# Altium footprint library Molex FFC - FPC Connectors (SMT).PcbLib: 638 footprints (part 9 of 40)
Each footprint in its own frame and in the unit in brackets; x right, y up, seen from the top. Pads: shape width x height; smd on the part's side, far side on the other; paste and mask are expansions set on the pad; w line width, h text height; cw(c..) or ccw(c..) is an arc to the next point about the centre after c.
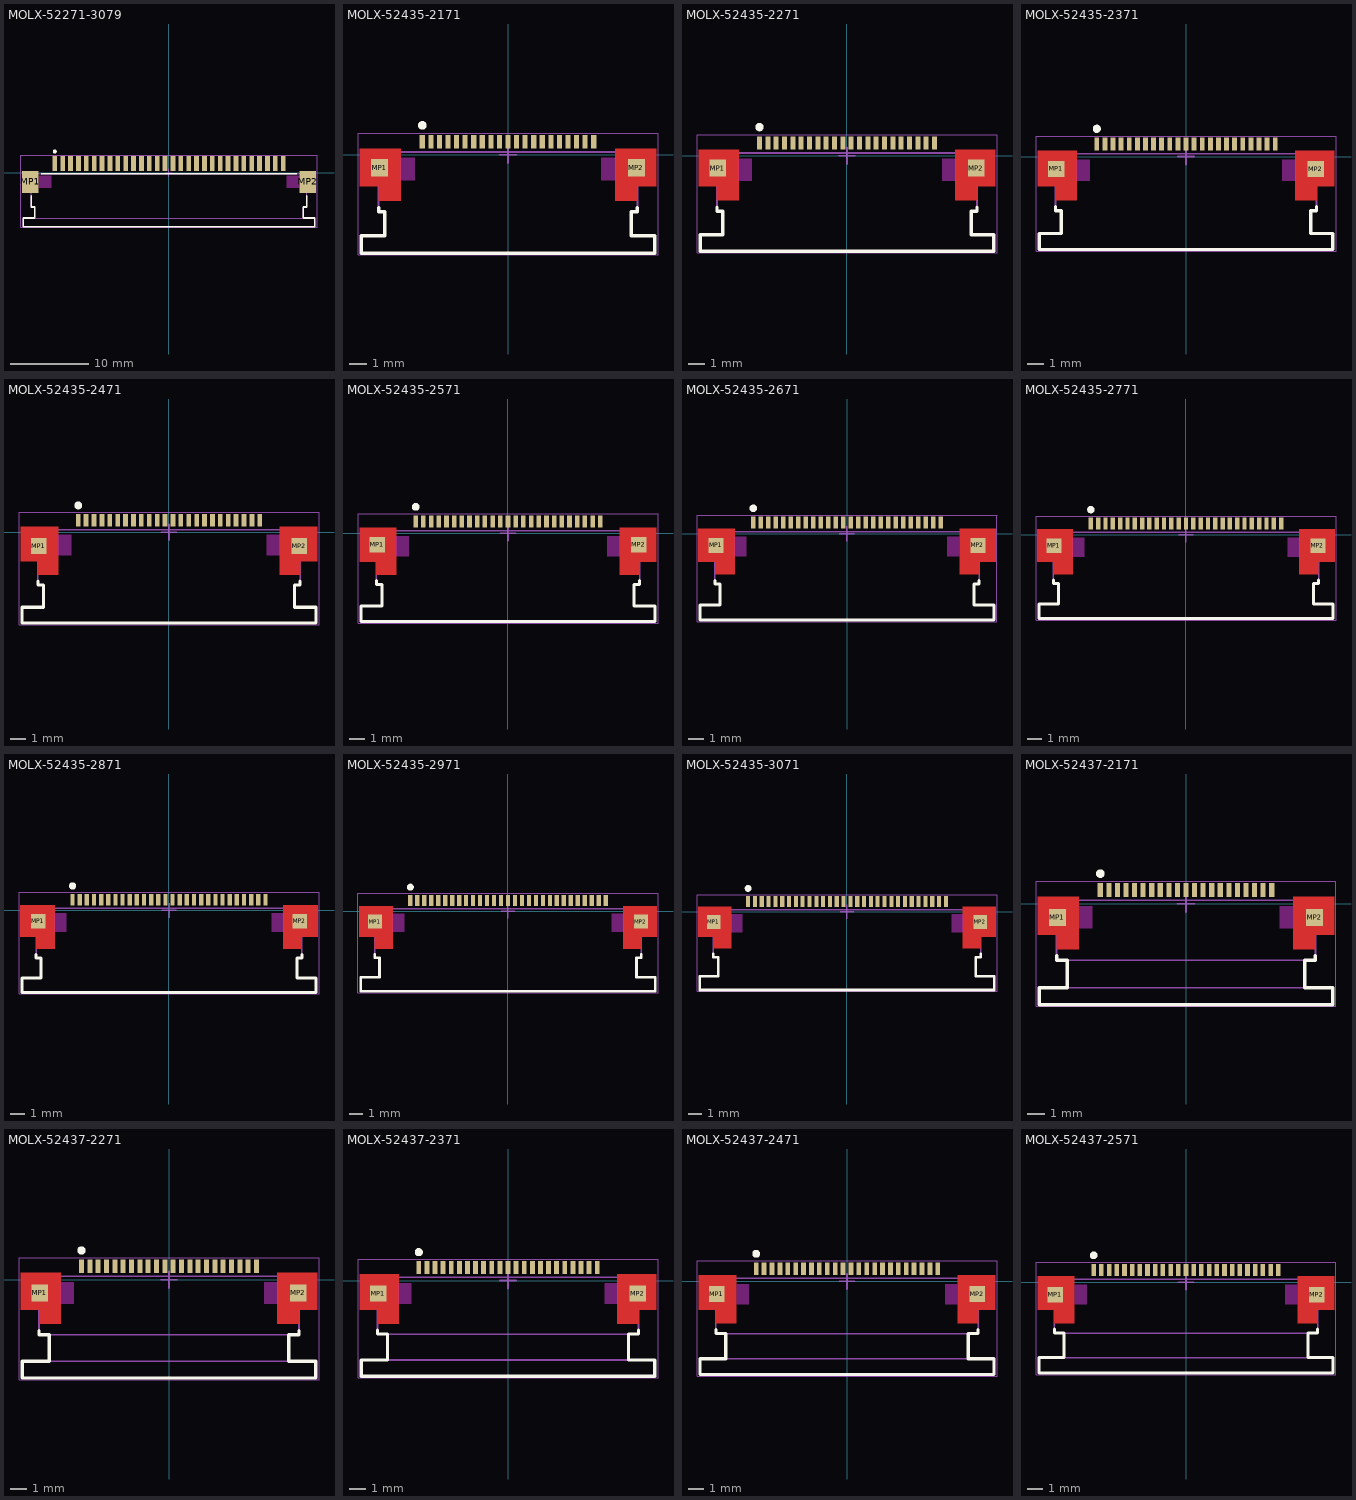
[diagram p8: the footprints below, top view; thin cyan lines are the x and y axes]

## MOLX-52271-3079 [mm] "FPC Connector, 30-Leads, Right Angle, Pitch 1.0 mm, Mated Height 3.0 mm, SMT"
height 3.012
pads (32):
  rect 0.6x1.9 smd: 1(-14.5,1.175) 2(-13.5,1.175) 3(-12.5,1.175) 4(-11.5,1.175) 5(-10.5,1.175) 6(-9.5,1.175) 7(-8.5,1.175) 8(-7.5,1.175) 9(-6.5,1.175) 10(-5.5,1.175) 11(-4.5,1.175) 12(-3.5,1.175) 13(-2.5,1.175) 14(-1.5,1.175) 15(-0.5,1.175) 16(0.5,1.175) 17(1.5,1.175) 18(2.5,1.175) 19(3.5,1.175) 20(4.5,1.175) 21(5.5,1.175) 22(6.5,1.175) 23(7.5,1.175) 24(8.5,1.175) 25(9.5,1.175) 26(10.5,1.175) 27(11.5,1.175) 28(12.5,1.175) 29(13.5,1.175) 30(14.5,1.175)
  rect 2.1x2.8 smd: MP1(-17.65,-1.175) MP2(17.65,-1.175)
Top Overlay:
  circle w0.25: c-14.5,2.675 r0.125
  lines w0.2: -17.5,-2.975 -17.5,-4.375 -17.05,-4.375 -17.05,-5.775 -18.5,-5.775 -18.5,-6.875 18.5,-6.875 18.5,-5.775 17.05,-5.775 17.05,-4.375 17.5,-4.375 17.5,-2.975 ; -16.2,-0.175 16.2,-0.175
Keep-Out Layer:
  region: -14.95,-0.375 -16.6,-0.375 -16.6,-1.975 -14.95,-1.975
  region: -14.95,-0.375 -16.6,-0.375 -16.6,-1.975 -14.95,-1.975
  rectangle: 14.95,-1.975 16.6,-0.375
Mechanical 13:
  lines w0.1: -17.05,-5.775 -17.05,-4.375 -17.5,-4.375 -17.5,-0.175 17.5,-0.175 17.5,-4.375 17.05,-4.375 17.05,-5.775 ; -18.5,-6.875 -18.5,-5.775 18.5,-5.775 18.5,-6.875 -18.5,-6.875
Mechanical 15:
  lines w0.05: -18.8,-6.975 -18.8,2.225 18.8,2.225 18.8,-6.975 -18.8,-6.975
  lines w0.1: -0.5,0 0.5,0 ; 0,-0.5 0,0.5
3D body: height 0.25, standoff 0, extent -18.5,-6.875 18.5,1.825

## MOLX-52435-2171 [mm] "FPC Connector, 21-Leads, Right Angle, Pitch 0.5 mm, Mated Height 2.0 mm, SMT"
height 2.05
pads (23):
  rect 0.3x0.8 smd: 1(-5,0.762) 2(-4.5,0.762) 3(-4,0.762) 4(-3.5,0.762) 5(-3,0.762) 6(-2.5,0.762) 7(-2,0.762) 8(-1.5,0.762) 9(-1,0.762) 10(-0.5,0.762) 11(0,0.762) 12(0.5,0.762) 13(1,0.762) 14(1.5,0.762) 15(2,0.762) 16(2.5,0.762) 17(3,0.762) 18(3.5,0.762) 19(4,0.762) 20(4.5,0.762) 21(5,0.762)
  rect 1x1 smd paste-0.06: MP1(-7.493,-0.762) MP2(7.493,-0.762)
Top Layer:
  region: -6.25,0.362 -8.65,0.362 -8.65,-1.838 -7.55,-1.838 -7.55,-2.688 -6.25,-2.688
  region: 6.25,0.362 8.65,0.362 8.65,-1.838 7.55,-1.838 7.55,-2.688 6.25,-2.688
Top Overlay:
  circle w0.25: c-5,1.712 r0.125
  lines w0.2: -7.55,-3.088 -7.55,-3.338 -7.2,-3.338 -7.2,-4.738 -8.55,-4.738 -8.55,-5.738 8.55,-5.738 8.55,-4.738 7.2,-4.738 7.2,-3.338 7.55,-3.338 7.55,-3.088
Keep-Out Layer:
  region: -6.25,-0.188 -5.45,-0.188 -5.45,-1.488 -6.25,-1.488
  region: 6.25,-0.188 5.45,-0.188 5.45,-1.488 6.25,-1.488
Mechanical 13:
  lines w0.1: -7.2,-3.338 -7.55,-3.338 -7.55,0.162 7.55,0.162 7.55,-3.338 7.2,-3.338 7.2,-4.738 8.55,-4.738 8.55,-5.738 -8.55,-5.738 -8.55,-4.738 -7.2,-4.738 -7.2,-3.338
Mechanical 15:
  lines w0.05: -8.75,-5.838 8.75,-5.838 8.75,1.262 -8.75,1.262 -8.75,-5.838
  lines w0.1: -0.5,0 0.5,0 ; 0,-0.5 0,0.5
3D body: height 0.25, standoff 0, extent -8.55,-5.738 8.55,0.862

## MOLX-52435-2271 [mm] "FPC Connector, 22-Leads, Right Angle, Pitch 0.5 mm, Mated Height 2.0 mm, SMT"
height 2.05
pads (24):
  rect 0.3x0.8 smd: 1(-5.25,0.762) 2(-4.75,0.762) 3(-4.25,0.762) 4(-3.75,0.762) 5(-3.25,0.762) 6(-2.75,0.762) 7(-2.25,0.762) 8(-1.75,0.762) 9(-1.25,0.762) 10(-0.75,0.762) 11(-0.25,0.762) 12(0.25,0.762) 13(0.75,0.762) 14(1.25,0.762) 15(1.75,0.762) 16(2.25,0.762) 17(2.75,0.762) 18(3.25,0.762) 19(3.75,0.762) 20(4.25,0.762) 21(4.75,0.762) 22(5.25,0.762)
  rect 1x1 smd: MP1(-7.75,-0.742) MP2(7.75,-0.742)
Top Layer:
  region: -6.5,0.362 -8.9,0.362 -8.9,-1.838 -7.8,-1.838 -7.8,-2.688 -6.5,-2.688
  region: 6.5,0.362 8.9,0.362 8.9,-1.838 7.8,-1.838 7.8,-2.688 6.5,-2.688
Top Overlay:
  circle w0.25: c-5.25,1.712 r0.125
  lines w0.2: -7.8,-3.088 -7.8,-3.338 -7.45,-3.338 -7.45,-4.738 -8.8,-4.738 -8.8,-5.738 8.8,-5.738 8.8,-4.738 7.45,-4.738 7.45,-3.339 7.8,-3.339 7.8,-3.088
Keep-Out Layer:
  region: 5.7,-0.198 6.5,-0.198 6.5,-1.498 5.7,-1.498
  region: -6.5,-0.198 -5.7,-0.198 -5.7,-1.498 -6.5,-1.498
Mechanical 13:
  lines w0.1: -8.8,-5.738 8.8,-5.738 8.8,-4.738 7.45,-4.738 7.45,-3.338 7.8,-3.338 7.8,0.162 -7.8,0.162 -7.8,-3.338 -7.45,-3.338 -7.45,-4.738 -8.8,-4.738 -8.8,-5.738
Mechanical 15:
  lines w0.05: -9,-5.838 -9,1.262 9,1.262 9,-5.838 -9,-5.838
  lines w0.1: -0.5,0 0.5,0 ; 0,-0.5 0,0.5
3D body: height 0.25, standoff 0, extent -8.8,-5.738 8.8,0.862

## MOLX-52435-2371 [mm] "FPC Connector, 23-Leads, Right Angle, Pitch 0.5 mm, Mated Height 2.0 mm, SMT"
height 2.05
pads (25):
  rect 0.3x0.8 smd: 1(-5.5,0.762) 2(-5,0.762) 3(-4.5,0.762) 4(-4,0.762) 5(-3.5,0.762) 6(-3,0.762) 7(-2.5,0.762) 8(-2,0.762) 9(-1.5,0.762) 10(-1,0.762) 11(-0.5,0.762) 12(0,0.762) 13(0.5,0.762) 14(1,0.762) 15(1.5,0.762) 16(2,0.762) 17(2.5,0.762) 18(3,0.762) 19(3.5,0.762) 20(4,0.762) 21(4.5,0.762) 22(5,0.762) 23(5.5,0.762)
  rect 1x1 smd: MP1(-8,-0.767) MP2(8,-0.772)
Top Layer:
  region: -6.75,0.362 -9.15,0.362 -9.15,-1.838 -8.05,-1.838 -8.05,-2.688 -6.75,-2.688
  region: 6.75,0.362 9.15,0.362 9.15,-1.838 8.05,-1.838 8.05,-2.688 6.75,-2.688
Top Overlay:
  circle w0.25: c-5.5,1.712 r0.125
  lines w0.2: -8.05,-3.088 -8.05,-3.338 -7.7,-3.338 -7.7,-4.738 -9.05,-4.738 -9.05,-5.738 9.05,-5.738 9.05,-4.738 7.7,-4.738 7.7,-3.338 8.05,-3.338 8.05,-3.088
Keep-Out Layer:
  region: -6.75,-0.183 -5.95,-0.183 -5.95,-1.483 -6.75,-1.483
  region: 5.95,-0.183 6.75,-0.183 6.75,-1.483 5.95,-1.483
Mechanical 13:
  lines w0.1: 8.05,0.162 -8.05,0.162 -8.05,-3.338 -7.7,-3.338 -7.7,-4.738 -9.05,-4.738 -9.05,-5.738 9.05,-5.738 9.05,-4.738 7.7,-4.738 7.7,-3.338 8.05,-3.338 8.05,0.162
Mechanical 15:
  lines w0.05: -9.25,-5.838 9.25,-5.838 9.25,1.262 -9.25,1.262 -9.25,-5.838
  lines w0.1: -0.5,0 0.5,0 ; 0,-0.5 0,0.5
3D body: height 0.25, standoff 0, extent -9.05,-5.738 9.05,0.862

## MOLX-52435-2471 [mm] "FPC Connector, 24-Leads, Right Angle, Pitch 0.5 mm, Mated Height 2.0 mm, SMT"
height 2.05
pads (26):
  rect 0.3x0.8 smd: 1(-5.75,0.762) 2(-5.25,0.762) 3(-4.75,0.762) 4(-4.25,0.762) 5(-3.75,0.762) 6(-3.25,0.762) 7(-2.75,0.762) 8(-2.25,0.762) 9(-1.75,0.762) 10(-1.25,0.762) 11(-0.75,0.762) 12(-0.25,0.762) 13(0.25,0.762) 14(0.75,0.762) 15(1.25,0.762) 16(1.75,0.762) 17(2.25,0.762) 18(2.75,0.762) 19(3.25,0.762) 20(3.75,0.762) 21(4.25,0.762) 22(4.75,0.762) 23(5.25,0.762) 24(5.75,0.762)
  rect 1x1 smd: MP1(-8.25,-0.863) MP2(8.25,-0.863)
Top Layer:
  region: 7,0.362 9.4,0.362 9.4,-1.838 8.3,-1.838 8.3,-2.688 7,-2.688
  region: -7,0.362 -9.4,0.362 -9.4,-1.838 -8.3,-1.838 -8.3,-2.688 -7,-2.688
Top Overlay:
  circle w0.25: c-5.75,1.712 r0.125
  lines w0.2: -8.3,-3.338 -7.95,-3.338 -7.95,-4.738 -9.3,-4.738 -9.3,-5.738 ; -8.3,-3.338 -8.3,-3.088 ; 8.3,-3.338 8.3,-3.088 ; 8.3,-3.338 7.95,-3.338 7.95,-4.738 9.3,-4.738 9.3,-5.738 ; -9.3,-5.738 -9.3,-5.738 ; -9.3,-5.738 9.3,-5.738 ; 9.3,-5.738 9.3,-5.738
Keep-Out Layer:
  region: 6.2,-0.137 7,-0.137 7,-1.438 6.2,-1.438
  region: -7,-0.137 -6.2,-0.137 -6.2,-1.438 -7,-1.438
Mechanical 13:
  lines w0.1: -8.3,-3.338 -7.95,-3.338 ; -8.3,-3.338 -8.3,0.162 8.3,0.162 8.3,-3.338 ; -7.95,-3.338 -7.95,-4.738 -9.3,-4.738 -9.3,-5.738 9.3,-5.738 9.3,-4.738 7.95,-4.738 7.95,-3.338 ; 7.95,-3.338 8.3,-3.338
Mechanical 15:
  lines w0.05: -9.5,-5.838 9.5,-5.838 9.5,1.262 -9.5,1.262 -9.5,-5.838
  lines w0.1: -0.5,0 0.5,0 ; 0,-0.5 0,0.5
3D body: height 0.25, standoff 0, extent -9.3,-5.738 9.3,0.862

## MOLX-52435-2571 [mm] "FPC Connector, 25-Leads, Right Angle, Pitch 0.5 mm, Mated Height 2.0 mm, SMT"
height 2.05
pads (27):
  rect 0.3x0.8 smd: 1(-6,0.762) 2(-5.5,0.762) 3(-5,0.762) 4(-4.5,0.762) 5(-4,0.762) 6(-3.5,0.762) 7(-3,0.762) 8(-2.5,0.762) 9(-2,0.762) 10(-1.5,0.762) 11(-1,0.762) 12(-0.5,0.762) 13(0,0.762) 14(0.5,0.762) 15(1,0.762) 16(1.5,0.762) 17(2,0.762) 18(2.5,0.762) 19(3,0.762) 20(3.5,0.762) 21(4,0.762) 22(4.5,0.762) 23(5,0.762) 24(5.5,0.762) 25(6,0.762)
  rect 1x1 smd: MP1(-8.509,-0.752) MP2(8.509,-0.752)
Top Layer:
  region: -7.25,0.362 -9.65,0.362 -9.65,-1.838 -8.55,-1.838 -8.55,-2.688 -7.25,-2.688
  region: 7.25,0.362 9.65,0.362 9.65,-1.838 8.55,-1.838 8.55,-2.688 7.25,-2.688
Top Overlay:
  circle w0.25: c-6,1.712 r0.125
  lines w0.2: -8.55,-3.338 -8.2,-3.338 -8.2,-4.738 -9.55,-4.738 -9.55,-5.738 9.55,-5.738 9.55,-4.738 8.2,-4.738 8.2,-3.338 8.55,-3.338 ; -8.55,-3.338 -8.55,-3.088 ; 8.55,-3.338 8.55,-3.088
Keep-Out Layer:
  region: -7.25,-0.193 -6.45,-0.193 -6.45,-1.493 -7.25,-1.493
  region: 6.45,-0.193 7.25,-0.193 7.25,-1.493 6.45,-1.493
Mechanical 13:
  lines w0.1: -8.55,-3.338 -8.2,-3.338 ; -8.55,-3.338 -8.55,0.162 8.55,0.162 8.55,-3.338 ; -8.2,-3.338 -8.2,-4.738 -9.55,-4.738 -9.55,-5.738 9.55,-5.738 9.55,-4.738 8.2,-4.738 8.2,-3.338 ; 8.2,-3.338 8.55,-3.338
Mechanical 15:
  lines w0.05: -9.75,-5.838 -9.75,1.262 9.75,1.262 9.75,-5.838 -9.75,-5.838
  lines w0.1: -0.5,0 0.5,0 ; 0,-0.5 0,0.5
3D body: height 0.25, standoff 0, extent -9.55,-5.738 9.55,0.862

## MOLX-52435-2671 [mm] "FPC Connector, 26-Leads, Right Angle, Pitch 0.5 mm, Mated Height 2.0 mm, SMT"
height 2.062
pads (28):
  rect 0.3x0.8 smd: 1(-6.25,0.762) 2(-5.75,0.762) 3(-5.25,0.762) 4(-4.75,0.762) 5(-4.25,0.762) 6(-3.75,0.762) 7(-3.25,0.762) 8(-2.75,0.762) 9(-2.25,0.762) 10(-1.75,0.762) 11(-1.25,0.762) 12(-0.75,0.762) 13(-0.25,0.762) 14(0.25,0.762) 15(0.75,0.762) 16(1.25,0.762) 17(1.75,0.762) 18(2.25,0.762) 19(2.75,0.762) 20(3.25,0.762) 21(3.75,0.762) 22(4.25,0.762) 23(4.75,0.762) 24(5.25,0.762) 25(5.75,0.762) 26(6.25,0.762)
  rect 1x1 smd paste+0 mask+0: MP1(-8.727,-0.762) MP2(8.727,-0.762)
Top Layer:
  region: 7.5,0.362 9.9,0.362 9.9,-1.838 8.8,-1.838 8.8,-2.688 7.5,-2.688
  region: -7.5,0.362 -9.9,0.362 -9.9,-1.838 -8.8,-1.838 -8.8,-2.688 -7.5,-2.688
Top Overlay:
  circle w0.25: c-6.25,1.712 r0.125
  lines w0.2: -8.8,-3.088 -8.8,-3.338 -8.45,-3.338 -8.45,-4.738 -9.8,-4.738 -9.8,-5.738 ; 8.8,-3.088 8.8,-3.338 8.45,-3.338 8.45,-4.738 9.8,-4.738 ; 9.8,-4.738 9.8,-5.738 -9.8,-5.738 ; -9.8,-5.738 -9.8,-5.738
Keep-Out Layer:
  region: -7.5,-0.188 -6.7,-0.188 -6.7,-1.488 -7.5,-1.488
  region: 6.7,-0.188 7.5,-0.188 7.5,-1.488 6.7,-1.488
Mechanical 13:
  lines w0.1: -9.8,-5.738 9.8,-5.738 9.8,-4.738 8.45,-4.738 8.45,-3.338 8.8,-3.338 8.8,0.162 -8.8,0.162 -8.8,-3.338 -8.45,-3.338 -8.45,-4.738 -9.8,-4.738 -9.8,-5.738
Mechanical 15:
  lines w0.05: -10,-5.838 -10,1.262 10,1.262 10,-5.838 -10,-5.838
  lines w0.1: -0.5,0 0.5,0 ; 0,-0.5 0,0.5
3D body: height 0.25, standoff 0, extent -9.8,-5.738 9.8,0.862

## MOLX-52435-2771 [mm] "FPC Connector, 27-Leads, Right Angle, Pitch 0.5 mm, Mated Height 2.0 mm, SMT"
height 2.05
pads (29):
  rect 0.3x0.8 smd: 1(-6.5,0.762) 2(-6,0.762) 3(-5.5,0.762) 4(-5,0.762) 5(-4.5,0.762) 6(-4,0.762) 7(-3.5,0.762) 8(-3,0.762) 9(-2.5,0.762) 10(-2,0.762) 11(-1.5,0.762) 12(-1,0.762) 13(-0.5,0.762) 14(0,0.762) 15(0.5,0.762) 16(1,0.762) 17(1.5,0.762) 18(2,0.762) 19(2.5,0.762) 20(3,0.762) 21(3.5,0.762) 22(4,0.762) 23(4.5,0.762) 24(5,0.762) 25(5.5,0.762) 26(6,0.762) 27(6.5,0.762)
  rect 1x1 smd: MP1(-9.017,-0.752) MP2(9.017,-0.752)
Top Layer:
  region: 7.75,0.362 10.15,0.362 10.15,-1.838 9.05,-1.838 9.05,-2.688 7.75,-2.688
  region: -7.75,0.362 -10.15,0.362 -10.15,-1.838 -9.05,-1.838 -9.05,-2.688 -7.75,-2.688
Top Overlay:
  circle w0.25: c-6.5,1.712 r0.125
  lines w0.2: -9.05,-3.088 -9.05,-3.338 -8.7,-3.338 -8.7,-4.738 -10.05,-4.738 -10.05,-5.738 10.05,-5.738 10.05,-4.738 8.7,-4.738 8.7,-3.338 9.05,-3.338 9.05,-3.088
Keep-Out Layer:
  region: 6.95,-0.193 7.75,-0.193 7.75,-1.493 6.95,-1.493
  region: -7.75,-0.193 -6.95,-0.193 -6.95,-1.493 -7.75,-1.493
Mechanical 13:
  lines w0.1: -10.055,-4.738 -8.705,-4.738 -8.705,-3.338 ; -10.05,-4.738 -10.05,-5.738 10.05,-5.738 10.05,-4.738 ; -9.055,0.162 -9.055,-3.338 -8.705,-3.338 ; -9.05,0.162 9.05,0.162 ; 8.705,-3.338 9.055,-3.338 9.055,0.162 ; 8.705,-3.338 8.705,-4.738 10.055,-4.738
Mechanical 15:
  lines w0.05: -10.25,-5.838 10.25,-5.838 10.25,1.262 -10.25,1.262 -10.25,-5.838
  lines w0.1: -0.5,0 0.5,0 ; 0,-0.5 0,0.5
3D body: height 0.25, standoff 0, extent -10.05,-5.743 10.05,0.857

## MOLX-52435-2871 [mm] "FPC Connector, 28-Leads, Right Angle, Pitch 0.5 mm, Mated Height 2.0 mm, SMT"
height 2.05
pads (30):
  rect 0.3x0.8 smd: 1(-6.75,0.762) 2(-6.25,0.762) 3(-5.75,0.762) 4(-5.25,0.762) 5(-4.75,0.762) 6(-4.25,0.762) 7(-3.75,0.762) 8(-3.25,0.762) 9(-2.75,0.762) 10(-2.25,0.762) 11(-1.75,0.762) 12(-1.25,0.762) 13(-0.75,0.762) 14(-0.25,0.762) 15(0.25,0.762) 16(0.75,0.762) 17(1.25,0.762) 18(1.75,0.762) 19(2.25,0.762) 20(2.75,0.762) 21(3.25,0.762) 22(3.75,0.762) 23(4.25,0.762) 24(4.75,0.762) 25(5.25,0.762) 26(5.75,0.762) 27(6.25,0.762) 28(6.75,0.762)
  rect 1x1 smd: MP1(-9.144,-0.752) MP2(9.144,-0.752)
Top Layer:
  region: -8,0.362 -10.4,0.362 -10.4,-1.838 -9.3,-1.838 -9.3,-2.688 -8,-2.688
  region: 8,0.362 10.4,0.362 10.4,-1.838 9.3,-1.838 9.3,-2.688 8,-2.688
Top Overlay:
  circle w0.25: c-6.75,1.712 r0.125
  lines w0.2: -9.3,-3.088 -9.3,-3.338 -8.95,-3.338 -8.95,-4.738 -10.3,-4.738 -10.3,-5.738 10.3,-5.738 10.3,-4.738 8.95,-4.738 8.95,-3.338 9.3,-3.338 9.3,-3.088
Keep-Out Layer:
  region: 7.2,-0.193 8,-0.193 8,-1.493 7.2,-1.493
  region: -8,-0.193 -7.2,-0.193 -7.2,-1.493 -8,-1.493
Mechanical 13:
  lines w0.1: -8.95,-3.338 -9.3,-3.338 -9.3,0.162 9.3,0.162 9.3,-3.338 8.95,-3.338 ; -8.95,-3.338 -8.95,-4.738 -10.3,-4.738 -10.3,-5.738 10.3,-5.738 10.3,-4.738 8.95,-4.738 8.95,-3.338
Mechanical 15:
  lines w0.05: -10.5,-5.838 -10.5,1.262 10.5,1.262 10.5,-5.838 -10.5,-5.838
  lines w0.1: -0.5,0 0.5,0 ; 0,-0.5 0,0.5
3D body: height 0.25, standoff 0, extent -10.3,-5.738 10.3,0.862

## MOLX-52435-2971 [mm] "FPC Connector, 29-Leads, Right Angle, Pitch 0.5 mm, Mated Height 2.0 mm, SMT"
height 2.05
pads (31):
  rect 0.3x0.8 smd: 1(-7,0.762) 2(-6.5,0.762) 3(-6,0.762) 4(-5.5,0.762) 5(-5,0.762) 6(-4.5,0.762) 7(-4,0.762) 8(-3.5,0.762) 9(-3,0.762) 10(-2.5,0.762) 11(-2,0.762) 12(-1.5,0.762) 13(-1,0.762) 14(-0.5,0.762) 15(0,0.762) 16(0.5,0.762) 17(1,0.762) 18(1.5,0.762) 19(2,0.762) 20(2.5,0.762) 21(3,0.762) 22(3.5,0.762) 23(4,0.762) 24(4.5,0.762) 25(5,0.762) 26(5.5,0.762) 27(6,0.762) 28(6.5,0.762) 29(7,0.762)
  rect 1x1 smd: MP1(-9.525,-0.752) MP2(9.525,-0.752)
Top Layer:
  region: 8.25,0.362 10.65,0.362 10.65,-1.838 9.55,-1.838 9.55,-2.688 8.25,-2.688
  region: -8.25,0.362 -10.65,0.362 -10.65,-1.838 -9.55,-1.838 -9.55,-2.688 -8.25,-2.688
Top Overlay:
  circle w0.25: c-7,1.712 r0.125
  lines w0.2: -9.55,-3.088 -9.55,-3.338 -9.2,-3.338 -9.2,-4.738 -10.55,-4.738 -10.55,-5.738 10.55,-5.738 10.55,-4.738 9.2,-4.738 9.2,-3.338 9.55,-3.338 9.55,-3.088
Keep-Out Layer:
  region: 7.45,-0.193 8.25,-0.193 8.25,-1.493 7.45,-1.493
  region: -8.25,-0.193 -7.45,-0.193 -7.45,-1.493 -8.25,-1.493
Mechanical 13:
  lines w0.1: -9.2,-3.338 -9.55,-3.338 -9.55,0.162 9.55,0.162 9.55,-3.338 9.2,-3.338 ; -9.2,-3.338 -9.2,-4.738 -10.55,-4.738 -10.55,-5.738 10.55,-5.738 10.55,-4.738 9.2,-4.738 9.2,-3.338
Mechanical 15:
  lines w0.05: -10.75,-5.838 10.75,-5.838 10.75,1.262 -10.75,1.262 -10.75,-5.838
  lines w0.1: -0.5,0 0.5,0 ; 0,-0.5 0,0.5
3D body: height 0.25, standoff 0, extent -10.55,-5.738 10.55,0.862

## MOLX-52435-3071 [mm] "FPC Connector, 30-Leads, Right Angle, Pitch 0.5 mm, Mated Height 2.0 mm, SMT"
height 2.05
pads (32):
  rect 0.3x0.8 smd: 1(-7.25,0.762) 2(-6.75,0.762) 3(-6.25,0.762) 4(-5.75,0.762) 5(-5.25,0.762) 6(-4.75,0.762) 7(-4.25,0.762) 8(-3.75,0.762) 9(-3.25,0.762) 10(-2.75,0.762) 11(-2.25,0.762) 12(-1.75,0.762) 13(-1.25,0.762) 14(-0.75,0.762) 15(-0.25,0.762) 16(0.25,0.762) 17(0.75,0.762) 18(1.25,0.762) 19(1.75,0.762) 20(2.25,0.762) 21(2.75,0.762) 22(3.25,0.762) 23(3.75,0.762) 24(4.25,0.762) 25(4.75,0.762) 26(5.25,0.762) 27(5.75,0.762) 28(6.25,0.762) 29(6.75,0.762) 30(7.25,0.762)
  rect 1x1 smd: MP1(-9.779,-0.752) MP2(9.779,-0.752)
Top Layer:
  region: 8.5,0.362 10.9,0.362 10.9,-1.838 9.8,-1.838 9.8,-2.688 8.5,-2.688
  region: -8.5,0.362 -10.9,0.362 -10.9,-1.838 -9.8,-1.838 -9.8,-2.688 -8.5,-2.688
Top Overlay:
  circle w0.25: c-7.25,1.712 r0.125
  lines w0.2: -9.8,-3.088 -9.8,-3.338 -9.45,-3.338 -9.45,-4.738 -10.8,-4.738 -10.8,-5.738 10.8,-5.738 10.8,-4.738 9.45,-4.738 9.45,-3.338 9.8,-3.338 9.8,-3.088
Keep-Out Layer:
  region: -8.5,-0.193 -7.7,-0.193 -7.7,-1.493 -8.5,-1.493
  region: 8.5,-0.193 7.7,-0.193 7.7,-1.493 8.5,-1.493
Mechanical 13:
  lines w0.1: -9.45,-3.338 -9.8,-3.338 -9.8,0.162 9.8,0.162 9.8,-3.338 9.45,-3.338 ; -9.45,-3.338 -9.45,-4.738 -10.8,-4.738 -10.8,-5.738 10.8,-5.738 10.8,-4.738 9.45,-4.738 9.45,-3.338
Mechanical 15:
  lines w0.05: -11,-5.838 11,-5.838 11,1.262 -11,1.262 -11,-5.838
  lines w0.1: -0.5,0 0.5,0 ; 0,-0.5 0,0.5
3D body: height 0.25, standoff 0, extent -10.8,-5.738 10.8,0.862

## MOLX-52437-2171 [mm] "FPC Connector, 21-Leads, Right Angle, Pitch 0.5 mm, SMT"
height 2.052
pads (23):
  rect 0.3x0.8 smd: 1(-5,0.8) 2(-4.5,0.8) 3(-4,0.8) 4(-3.5,0.8) 5(-3,0.8) 6(-2.5,0.8) 7(-2,0.8) 8(-1.5,0.8) 9(-1,0.8) 10(-0.5,0.8) 11(0,0.8) 12(0.5,0.8) 13(1,0.8) 14(1.5,0.8) 15(2,0.8) 16(2.5,0.8) 17(3,0.8) 18(3.5,0.8) 19(4,0.8) 20(4.5,0.8) 21(5,0.8)
  rect 1x1 smd: MP1(-7.5,-0.8) MP2(7.5,-0.8)
Top Layer:
  region: -6.25,0.4 -8.65,0.4 -8.65,-1.8 -7.55,-1.8 -7.55,-2.65 -6.25,-2.65
  region: 6.25,0.4 8.65,0.4 8.65,-1.8 7.55,-1.8 7.55,-2.65 6.25,-2.65
Top Overlay:
  circle w0.25: c-5,1.75 r0.125
  lines w0.2: -7.551,-3.05 -7.551,-3.3 -6.931,-3.3 -6.931,-4.9 -8.55,-4.9 ; 7.55,-3.05 7.55,-3.3 6.929,-3.3 6.929,-4.9 8.55,-4.9 ; -8.55,-4.9 -8.55,-5.9 8.55,-5.9 8.55,-4.9 ; -8.55,-4.9 -8.55,-4.9 ; 8.55,-4.9 8.55,-4.9
Keep-Out Layer:
  region: -5.45,-0.15 -6.25,-0.15 -6.25,-1.45 -5.45,-1.45
  rectangle: 5.45,-1.45 6.25,-0.15
Mechanical 13:
  lines w0.1: -6.931,-4.9 6.929,-4.9 ; -6.931,-4.9 -6.931,-3.3 ; -6.931,-4.9 -8.55,-4.9 -8.55,-5.9 8.55,-5.9 8.55,-4.9 6.929,-4.9 ; -6.931,-3.3 6.929,-3.3 ; -6.931,-3.3 -7.551,-3.3 -7.551,0.2 7.55,0.2 7.55,-3.3 6.929,-3.3 ; 6.929,-4.9 6.929,-3.3
Mechanical 15:
  lines w0.05: -8.75,-6 -8.75,1.3 8.75,1.3 8.75,-6 -8.75,-6
  lines w0.1: -0.5,0 0.5,0 ; 0,-0.5 0,0.5
3D body: height 0.25, standoff 0, extent -8.55,-5.9 8.55,0.9

## MOLX-52437-2271 [mm] "FPC Connector, 22-Leads, Right Angle, Pitch 0.5 mm, SMT"
height 2.052
pads (24):
  rect 0.3x0.8 smd: 1(-5.25,0.8) 2(-4.75,0.8) 3(-4.25,0.8) 4(-3.75,0.8) 5(-3.25,0.8) 6(-2.75,0.8) 7(-2.25,0.8) 8(-1.75,0.8) 9(-1.25,0.8) 10(-0.75,0.8) 11(-0.25,0.8) 12(0.25,0.8) 13(0.75,0.8) 14(1.25,0.8) 15(1.75,0.8) 16(2.25,0.8) 17(2.75,0.8) 18(3.25,0.8) 19(3.75,0.8) 20(4.25,0.8) 21(4.75,0.8) 22(5.25,0.8)
  rect 1x1 smd: MP1(-7.75,-0.8) MP2(7.75,-0.8)
Top Layer:
  region: -6.5,0.4 -8.9,0.4 -8.9,-1.8 -7.8,-1.8 -7.8,-2.65 -6.5,-2.65
  region: 6.5,0.4 8.9,0.4 8.9,-1.8 7.8,-1.8 7.8,-2.65 6.5,-2.65
Top Overlay:
  circle w0.25: c-5.25,1.75 r0.125
  lines w0.2: -7.801,-3.05 -7.801,-3.3 -7.181,-3.3 -7.181,-4.9 -8.8,-4.9 ; 7.8,-3.05 7.8,-3.3 7.179,-3.3 7.179,-4.9 8.8,-4.9 ; -8.8,-4.9 -8.8,-5.9 8.8,-5.9 8.8,-4.9 ; -8.8,-4.9 -8.8,-4.9 ; 8.8,-4.9 8.8,-4.9
Keep-Out Layer:
  region: -5.7,-0.15 -6.5,-0.15 -6.5,-1.45 -5.7,-1.45
  rectangle: 5.7,-1.45 6.5,-0.15
Mechanical 13:
  lines w0.1: -7.181,-4.9 7.179,-4.9 ; -7.181,-4.9 -7.181,-3.3 ; -7.181,-4.9 -8.8,-4.9 -8.8,-5.9 8.8,-5.9 8.8,-4.9 7.179,-4.9 ; -7.181,-3.3 7.179,-3.3 ; -7.181,-3.3 -7.801,-3.3 -7.801,0.2 7.8,0.2 7.8,-3.3 7.179,-3.3 ; 7.179,-4.9 7.179,-3.3
Mechanical 15:
  lines w0.05: -9,-6 -9,1.3 9,1.3 9,-6 -9,-6
  lines w0.1: -0.5,0 0.5,0 ; 0,-0.5 0,0.5
3D body: height 0.25, standoff 0, extent -8.8,-5.9 8.8,0.9

## MOLX-52437-2371 [mm] "FPC Connector, 23-Leads, Right Angle, Pitch 0.5 mm, SMT"
height 2.052
pads (25):
  rect 0.3x0.8 smd: 1(-5.5,0.8) 2(-5,0.8) 3(-4.5,0.8) 4(-4,0.8) 5(-3.5,0.8) 6(-3,0.8) 7(-2.5,0.8) 8(-2,0.8) 9(-1.5,0.8) 10(-1,0.8) 11(-0.5,0.8) 12(0,0.8) 13(0.5,0.8) 14(1,0.8) 15(1.5,0.8) 16(2,0.8) 17(2.5,0.8) 18(3,0.8) 19(3.5,0.8) 20(4,0.8) 21(4.5,0.8) 22(5,0.8) 23(5.5,0.8)
  rect 1x1 smd: MP1(-8,-0.8) MP2(8,-0.8)
Top Layer:
  region: -6.75,0.4 -9.15,0.4 -9.15,-1.8 -8.05,-1.8 -8.05,-2.65 -6.75,-2.65
  region: 6.75,0.4 9.15,0.4 9.15,-1.8 8.05,-1.8 8.05,-2.65 6.75,-2.65
Top Overlay:
  circle w0.25: c-5.5,1.75 r0.125
  lines w0.2: -8.051,-3.05 -8.051,-3.3 -7.431,-3.3 -7.431,-4.9 -9.05,-4.9 ; 8.05,-3.05 8.05,-3.3 7.429,-3.3 7.429,-4.9 9.05,-4.9 ; -9.05,-4.9 -9.05,-5.9 9.05,-5.9 9.05,-4.9 ; -9.05,-4.9 -9.05,-4.9 ; 9.05,-4.9 9.05,-4.9
Keep-Out Layer:
  region: -5.95,-0.15 -6.75,-0.15 -6.75,-1.45 -5.95,-1.45
  rectangle: 5.95,-1.45 6.75,-0.15
Mechanical 13:
  lines w0.1: -7.431,-4.9 7.429,-4.9 ; -7.431,-4.9 -7.431,-3.3 ; -7.431,-4.9 -9.05,-4.9 -9.05,-5.9 9.05,-5.9 9.05,-4.9 7.429,-4.9 ; -7.431,-3.3 7.429,-3.3 ; -7.431,-3.3 -8.051,-3.3 -8.051,0.2 8.05,0.2 8.05,-3.3 7.429,-3.3 ; 7.429,-4.9 7.429,-3.3
Mechanical 15:
  lines w0.05: -9.25,-6 -9.25,1.3 9.25,1.3 9.25,-6 -9.25,-6
  lines w0.1: -0.5,0 0.5,0 ; 0,-0.5 0,0.5
3D body: height 0.25, standoff 0, extent -9.05,-5.9 9.05,0.9

## MOLX-52437-2471 [mm] "FPC Connector, 24-Leads, Right Angle, Pitch 0.5 mm, SMT"
height 2.052
pads (26):
  rect 0.3x0.8 smd: 1(-5.75,0.8) 2(-5.25,0.8) 3(-4.75,0.8) 4(-4.25,0.8) 5(-3.75,0.8) 6(-3.25,0.8) 7(-2.75,0.8) 8(-2.25,0.8) 9(-1.75,0.8) 10(-1.25,0.8) 11(-0.75,0.8) 12(-0.25,0.8) 13(0.25,0.8) 14(0.75,0.8) 15(1.25,0.8) 16(1.75,0.8) 17(2.25,0.8) 18(2.75,0.8) 19(3.25,0.8) 20(3.75,0.8) 21(4.25,0.8) 22(4.75,0.8) 23(5.25,0.8) 24(5.75,0.8)
  rect 1x1 smd: MP1(-8.25,-0.8) MP2(8.25,-0.8)
Top Layer:
  region: 7,0.4 9.4,0.4 9.4,-1.8 8.3,-1.8 8.3,-2.65 7,-2.65
  region: -7,0.4 -9.4,0.4 -9.4,-1.8 -8.3,-1.8 -8.3,-2.65 -7,-2.65
Top Overlay:
  circle w0.25: c-5.75,1.75 r0.125
  lines w0.2: -8.301,-3.05 -8.301,-3.3 -7.681,-3.3 -7.681,-4.9 -9.3,-4.9 ; 8.3,-3.05 8.3,-3.3 7.679,-3.3 7.679,-4.9 9.3,-4.9 ; -9.3,-4.9 -9.3,-4.9 ; -9.3,-4.9 -9.3,-5.9 9.3,-5.9 9.3,-4.9 ; 9.3,-4.9 9.3,-4.9
Keep-Out Layer:
  rectangle: 6.2,-1.45 7,-0.15
  region: -6.2,-0.15 -7,-0.15 -7,-1.45 -6.2,-1.45
Mechanical 13:
  lines w0.1: -7.681,-4.9 -9.3,-4.9 -9.3,-5.9 9.3,-5.9 9.3,-4.9 7.679,-4.9 ; -7.681,-4.9 -7.681,-3.3 ; -7.681,-4.9 7.679,-4.9 ; -7.681,-3.3 -8.301,-3.3 -8.301,0.2 8.3,0.2 8.3,-3.3 7.679,-3.3 ; -7.681,-3.3 7.679,-3.3 ; 7.679,-4.9 7.679,-3.3
Mechanical 15:
  lines w0.05: -9.5,-6 9.5,-6 9.5,1.3 -9.5,1.3 -9.5,-6
  lines w0.1: -0.5,0 0.5,0 ; 0,-0.5 0,0.5
3D body: height 0.25, standoff 0, extent -9.3,-5.9 9.3,0.9

## MOLX-52437-2571 [mm] "FPC Connector, 25-Leads, Right Angle, Pitch 0.5 mm, SMT"
height 2.052
pads (27):
  rect 0.3x0.8 smd: 1(-6,0.8) 2(-5.5,0.8) 3(-5,0.8) 4(-4.5,0.8) 5(-4,0.8) 6(-3.5,0.8) 7(-3,0.8) 8(-2.5,0.8) 9(-2,0.8) 10(-1.5,0.8) 11(-1,0.8) 12(-0.5,0.8) 13(0,0.8) 14(0.5,0.8) 15(1,0.8) 16(1.5,0.8) 17(2,0.8) 18(2.5,0.8) 19(3,0.8) 20(3.5,0.8) 21(4,0.8) 22(4.5,0.8) 23(5,0.8) 24(5.5,0.8) 25(6,0.8)
  rect 1x1 smd: MP1(-8.5,-0.8) MP2(8.5,-0.8)
Top Layer:
  region: 7.25,0.4 9.65,0.4 9.65,-1.8 8.55,-1.8 8.55,-2.65 7.25,-2.65
  region: -7.25,0.4 -9.65,0.4 -9.65,-1.8 -8.55,-1.8 -8.55,-2.65 -7.25,-2.65
Top Overlay:
  circle w0.25: c-6,1.75 r0.125
  lines w0.2: -8.551,-3.05 -8.551,-3.3 -7.931,-3.3 -7.931,-4.9 -9.55,-4.9 ; 8.55,-3.05 8.55,-3.3 7.929,-3.3 7.929,-4.9 9.55,-4.9 ; -9.55,-4.9 -9.55,-4.9 ; -9.55,-4.9 -9.55,-5.9 9.55,-5.9 9.55,-4.9 ; 9.55,-4.9 9.55,-4.9
Keep-Out Layer:
  rectangle: 6.45,-1.45 7.25,-0.15
  region: -6.45,-0.15 -7.25,-0.15 -7.25,-1.45 -6.45,-1.45
Mechanical 13:
  lines w0.1: -7.931,-4.9 -9.55,-4.9 -9.55,-5.9 9.55,-5.9 9.55,-4.9 7.929,-4.9 ; -7.931,-4.9 -7.931,-3.3 ; -7.931,-4.9 7.929,-4.9 ; -7.931,-3.3 -8.551,-3.3 -8.551,0.2 8.55,0.2 8.55,-3.3 7.929,-3.3 ; -7.931,-3.3 7.929,-3.3 ; 7.929,-4.9 7.929,-3.3
Mechanical 15:
  lines w0.05: -9.75,-6 9.75,-6 9.75,1.3 -9.75,1.3 -9.75,-6
  lines w0.1: -0.5,0 0.5,0 ; 0,-0.5 0,0.5
3D body: height 0.25, standoff 0, extent -9.55,-5.9 9.55,0.9